# Altium footprint library WR-TBL_Wire Protector.PcbLib: 120 footprints (part 3 of 8)
Each footprint in its own frame and in the unit in brackets; x right, y up, seen from the top. Pads: shape width x height; smd on the part's side, far side on the other; paste and mask are expansions set on the pad; w line width, h text height; cw(c..) or ccw(c..) is an arc to the next point about the centre after c.
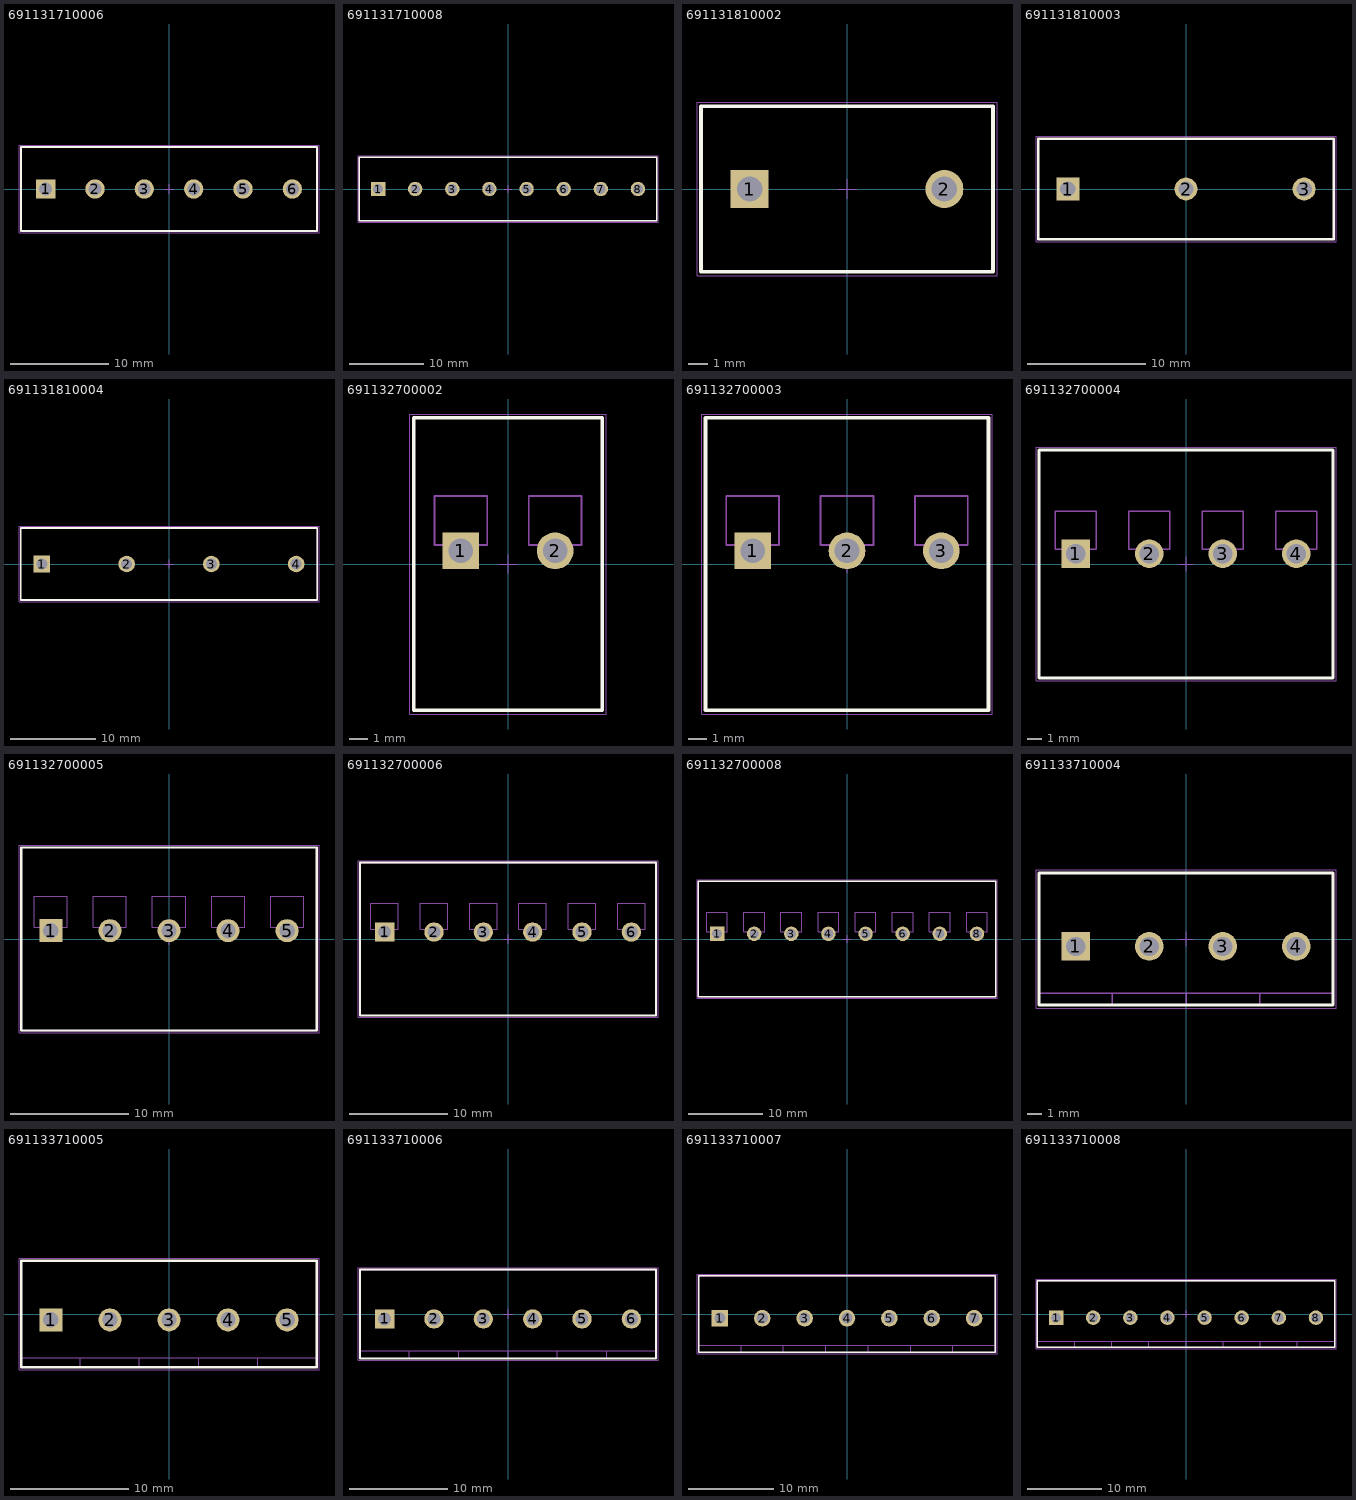
[diagram p2: the footprints below, top view; thin cyan lines are the x and y axes]

## 691131710006 [mm] "SERIE 1317 - 5.00 MM - HORIZONTAL CABLE ENTRY WITH PRESSURE CLAMP - WR-TBL"
height 15.5
pads (6):
  rect 1.95x1.95 hole 1.3: 1(-12.5,0)
  round 1.95 hole 1.3: 2(-7.5,0) 3(-2.5,0) 4(2.5,0) 5(7.5,0) 6(12.5,0)
Top Overlay:
  lines w0.2: -15,-4.25 -15,4.25 15,4.25 15,-4.25 -15,-4.25
Mechanical 13:
  lines w0.1: -15,-4.25 15,-4.25 15,4.25 -15,4.25 -15,-4.25
Mechanical 15:
  lines w0.05: -0.5,0 0.5,0 ; 0,-0.5 0,0.5 ; -15.2,-4.45 -15.2,4.45 15.2,4.45 15.2,-4.45 -15.2,-4.45
3D body "691131710006.stp": height 15.5, standoff -4.45, extent -15,-4.25 15,4.25

## 691131710008 [mm] "SERIE 1317 - 5.00 MM - HORIZONTAL CABLE ENTRY WITH PRESSURE CLAMP - WR-TBL"
height 15.5
pads (8):
  rect 1.95x1.95 hole 1.3: 1(-17.5,0)
  round 1.95 hole 1.3: 2(-12.5,0) 3(-7.5,0) 4(-2.5,0) 5(2.5,0) 6(7.5,0) 7(12.5,0) 8(17.5,0)
Top Overlay:
  lines w0.2: -20,-4.25 -20,4.25 20,4.25 20,-4.25 -20,-4.25
Mechanical 13:
  lines w0.1: -20,-4.25 20,-4.25 20,4.25 -20,4.25 -20,-4.25
Mechanical 15:
  lines w0.05: -0.5,0 0.5,0 ; 0,-0.5 0,0.5 ; -20.2,-4.45 -20.2,4.45 20.2,4.45 20.2,-4.45 -20.2,-4.45
3D body "691131710008.stp": height 15.5, standoff -4.45, extent -20,-4.25 20,4.25

## 691131810002 [mm] "Serie 1318 - 10.00 mm _2 pins"
height 15.5
pads (2):
  rect 1.95x1.95 hole 1.3: 1(-5,0)
  round 1.95 hole 1.3: 2(5,0)
Top Overlay:
  lines w0.2: -7.5,-4.25 -7.5,4.25 7.5,4.25 7.5,-4.25 -7.5,-4.25
Mechanical 13:
  lines w0.1: -7.5,-4.25 7.5,-4.25 7.5,4.25 -7.5,4.25 -7.5,-4.25
Mechanical 15:
  lines w0.05: -0.5,0 0.5,0 ; 0,-0.5 0,0.5 ; -7.7,-4.45 7.7,-4.45 7.7,4.45 -7.7,4.45 -7.7,-4.45
3D body "691131810002.stp": height 15.55, standoff -4.4, extent -7.5,-4.25 7.5,4.25

## 691131810003 [mm] "Serie 1318 - 10.00 mm _3 pins"
height 15.5
pads (3):
  rect 1.95x1.95 hole 1.3: 1(-10,0)
  round 1.95 hole 1.3: 2(0,0) 3(10,0)
Top Overlay:
  lines w0.2: -12.5,-4.25 -12.5,4.25 12.5,4.25 12.5,-4.25 -12.5,-4.25
Mechanical 13:
  lines w0.1: -12.5,-4.25 12.5,-4.25 12.5,4.25 -12.5,4.25 -12.5,-4.25
Mechanical 15:
  lines w0.05: -0.5,0 0.5,0 ; 0,-0.5 0,0.5 ; -12.7,-4.45 12.7,-4.45 12.7,4.45 -12.7,4.45 -12.7,-4.45
3D body "691131810003.stp": height 15.55, standoff -4.4, extent -12.5,-4.25 12.5,4.25

## 691131810004 [mm] "Serie 1318 - 10.00 mm _4 pins"
height 15.5
pads (4):
  rect 1.95x1.95 hole 1.3: 1(-15,0)
  round 1.95 hole 1.3: 2(-5,0) 3(5,0) 4(15,0)
Top Overlay:
  lines w0.2: -17.5,-4.25 -17.5,4.25 17.5,4.25 17.5,-4.25 -17.5,-4.25
Mechanical 13:
  lines w0.1: -17.5,-4.25 17.5,-4.25 17.5,4.25 -17.5,4.25 -17.5,-4.25
Mechanical 15:
  lines w0.05: -0.5,0 0.5,0 ; 0,-0.5 0,0.5 ; -17.7,-4.45 17.7,-4.45 17.7,4.45 -17.7,4.45 -17.7,-4.45
3D body "691131810004.stp": height 15.55, standoff -4.4, extent -17.5,-4.25 17.5,4.25

## 691132700002 [mm] "Vertical Entry with Pressure Clamp divisible, pitch 5mm, 02p"
height 10.5
pads (2):
  rect 1.95x1.95 hole 1.3: 1(-2.5,0.7)
  round 1.95 hole 1.3: 2(2.5,0.7)
Top Overlay:
  lines w0.2: -5,-7.75 -5,7.75 5,7.75 5,-7.75 -5,-7.75
Mechanical 13:
  lines w0.1: -5,-7.75 5,-7.75 5,7.75 -5,7.75 -5,-7.75 ; -3.9,1 -3.9,3.6 -1.1,3.6 -1.1,1 -3.9,1 ; 1.1,1 3.9,1 3.9,3.6 1.1,3.6 1.1,1
Mechanical 15:
  lines w0.05: -0.5,0 0.5,0 ; 0,-0.5 0,0.5 ; -5.2,-7.95 5.2,-7.95 5.2,7.95 -5.2,7.95 -5.2,-7.95
3D body "691132700002.stp": height 10.75, standoff -4.25, extent -5,-7.7 5,7.75

## 691132700003 [mm] "Vertical Entry with Pressure Clamp divisible, pitch 5mm, 03p"
height 10.5
pads (3):
  rect 1.95x1.95 hole 1.3: 1(-5,0.7)
  round 1.95 hole 1.3: 2(0,0.7) 3(5,0.7)
Top Overlay:
  lines w0.2: -7.5,-7.75 7.5,-7.75 7.5,7.75 -7.5,7.75 -7.5,-7.75
Mechanical 13:
  lines w0.1: -7.5,-7.75 -7.5,7.75 7.5,7.75 7.5,-7.75 -7.5,-7.75 ; -6.4,1 -3.6,1 -3.6,3.6 -6.4,3.6 -6.4,1 ; -1.4,1 -1.4,3.6 1.4,3.6 1.4,1 -1.4,1 ; 3.6,1 6.4,1 6.4,3.6 3.6,3.6 3.6,1
Mechanical 15:
  lines w0.05: -0.5,0 0.5,0 ; 0,-0.5 0,0.5 ; -7.7,-7.95 -7.7,7.95 7.7,7.95 7.7,-7.95 -7.7,-7.95
3D body "691132700003.stp": height 10.75, standoff -4.25, extent -7.5,-7.75 7.5,7.7

## 691132700004 [mm] "Vertical Entry with Pressure Clamp divisible, pitch 5mm, 04p"
height 10.5
pads (4):
  rect 1.95x1.95 hole 1.3: 1(-7.5,0.7)
  round 1.95 hole 1.3: 2(-2.5,0.7) 3(2.5,0.7) 4(7.5,0.7)
Top Overlay:
  lines w0.2: -10,-7.75 10,-7.75 10,7.75 -10,7.75 -10,-7.75
Mechanical 13:
  lines w0.1: -10,-7.75 -10,7.75 10,7.75 10,-7.75 -10,-7.75 ; -8.9,1 -6.1,1 -6.1,3.6 -8.9,3.6 -8.9,1 ; -3.9,1 -3.9,3.6 -1.1,3.6 -1.1,1 -3.9,1 ; 1.1,1 3.9,1 3.9,3.6 1.1,3.6 1.1,1 ; 6.1,1 6.1,3.6 8.9,3.6 8.9,1 6.1,1
Mechanical 15:
  lines w0.05: -0.5,0 0.5,0 ; 0,-0.5 0,0.5 ; -10.2,-7.95 -10.2,7.95 10.2,7.95 10.2,-7.95 -10.2,-7.95
3D body "691132700004.stp": height 10.75, standoff -4.25, extent -10,-7.75 10,7.7

## 691132700005 [mm] "Vertical Entry with Pressure Clamp divisible, pitch 5mm, 05p"
height 10.5
pads (5):
  rect 1.95x1.95 hole 1.3: 1(-10,0.7)
  round 1.95 hole 1.3: 2(-5,0.7) 3(0,0.7) 4(5,0.7) 5(10,0.7)
Top Overlay:
  lines w0.2: -12.5,-7.75 -12.5,7.75 12.5,7.75 12.5,-7.75 -12.5,-7.75
Mechanical 13:
  lines w0.1: -12.5,-7.75 12.5,-7.75 12.5,7.75 -12.5,7.75 -12.5,-7.75 ; -11.4,1 -11.4,3.6 -8.6,3.6 -8.6,1 -11.4,1 ; -6.4,1 -3.6,1 -3.6,3.6 -6.4,3.6 -6.4,1 ; -1.4,1 -1.4,3.6 1.4,3.6 1.4,1 -1.4,1 ; 3.6,1 6.4,1 6.4,3.6 3.6,3.6 3.6,1 ; 8.6,1 8.6,3.6 11.4,3.6 11.4,1 8.6,1
Mechanical 15:
  lines w0.05: -0.5,0 0.5,0 ; 0,-0.5 0,0.5 ; -12.7,-7.95 12.7,-7.95 12.7,7.95 -12.7,7.95 -12.7,-7.95
3D body "691132700005.stp": height 10.75, standoff -4.25, extent -12.5,-7.75 12.5,7.7

## 691132700006 [mm] "Vertical Entry with Pressure Clamp divisible, pitch 5mm, 06p"
height 10.5
pads (6):
  rect 1.95x1.95 hole 1.3: 1(-12.5,0.7)
  round 1.95 hole 1.3: 2(-7.5,0.7) 3(-2.5,0.7) 4(2.5,0.7) 5(7.5,0.7) 6(12.5,0.7)
Top Overlay:
  lines w0.2: -15,-7.75 -15,7.75 15,7.75 15,-7.75 -15,-7.75
Mechanical 13:
  lines w0.1: -15,-7.75 15,-7.75 15,7.75 -15,7.75 -15,-7.75 ; -13.9,1 -13.9,3.6 -11.1,3.6 -11.1,1 -13.9,1 ; -8.9,1 -6.1,1 -6.1,3.6 -8.9,3.6 -8.9,1 ; -3.9,1 -3.9,3.6 -1.1,3.6 -1.1,1 -3.9,1 ; 1.1,1 3.9,1 3.9,3.6 1.1,3.6 1.1,1 ; 6.1,1 6.1,3.6 8.9,3.6 8.9,1 6.1,1 ; 11.1,1 13.9,1 13.9,3.6 11.1,3.6 11.1,1
Mechanical 15:
  lines w0.05: -0.5,0 0.5,0 ; 0,-0.5 0,0.5 ; -15.2,-7.95 15.2,-7.95 15.2,7.95 -15.2,7.95 -15.2,-7.95
3D body "691132700006.stp": height 10.75, standoff -4.25, extent -15,-7.75 15,7.7

## 691132700008 [mm] "Vertical Entry with Pressure Clamp divisible, pitch 5mm, 08p"
height 10.5
pads (8):
  rect 1.95x1.95 hole 1.3: 1(-17.5,0.7)
  round 1.95 hole 1.3: 2(-12.5,0.7) 3(-7.5,0.7) 4(-2.5,0.7) 5(2.5,0.7) 6(7.5,0.7) 7(12.5,0.7) 8(17.5,0.7)
Top Overlay:
  lines w0.2: -20,-7.75 20,-7.75 20,7.75 -20,7.75 -20,-7.75
Mechanical 13:
  lines w0.1: -20,-7.75 -20,7.75 20,7.75 20,-7.75 -20,-7.75 ; -18.9,1 -16.1,1 -16.1,3.6 -18.9,3.6 -18.9,1 ; -13.9,1 -13.9,3.6 -11.1,3.6 -11.1,1 -13.9,1 ; -8.9,1 -6.1,1 -6.1,3.6 -8.9,3.6 -8.9,1 ; -3.9,1 -3.9,3.6 -1.1,3.6 -1.1,1 -3.9,1 ; 1.1,1 3.9,1 3.9,3.6 1.1,3.6 1.1,1 ; 6.1,1 6.1,3.6 8.9,3.6 8.9,1 6.1,1 ; 11.1,1 11.1,3.6 13.9,3.6 13.9,1 11.1,1 ; 16.1,1 18.9,1 18.9,3.6 16.1,3.6 16.1,1
Mechanical 15:
  lines w0.05: -0.5,0 0.5,0 ; 0,-0.5 0,0.5 ; -20.2,-7.95 -20.2,7.95 20.2,7.95 20.2,-7.95 -20.2,-7.95
3D body "691132700008.stp": height 10.75, standoff -4.25, extent -20,-7.75 20,7.7

## 691133710004 [mm] "Serie 1337 - 5.00 mm_4 pins"
height 13
pads (4):
  rect 1.95x1.95 hole 1.3: 1(-7.5,-0.5)
  round 1.95 hole 1.3: 2(-2.5,-0.5) 3(2.5,-0.5) 4(7.5,-0.5)
Top Overlay:
  lines w0.2: -10,-4.5 10,-4.5 10,4.5 -10,4.5 -10,-4.5
Mechanical 13:
  lines w0.1: -10,-3.7 10,-3.7 ; -5,-4.5 -5,-3.7 ; 0,-4.5 0,-3.7 ; 5,-4.5 5,-3.7 ; -10,-4.5 -10,4.5 10,4.5 10,-4.5 -10,-4.5
Mechanical 15:
  lines w0.05: -0.5,0 0.5,0 ; 0,-0.5 0,0.5 ; -10.2,-4.7 10.2,-4.7 10.2,4.7 -10.2,4.7 -10.2,-4.7
3D body "691133710004.stp": height 13.1, standoff -3.5, extent -10,-4.5 10,4.5

## 691133710005 [mm] "Serie 1337 - 5.00 mm_5 pins"
height 13
pads (5):
  rect 1.95x1.95 hole 1.3: 1(-10,-0.5)
  round 1.95 hole 1.3: 2(-5,-0.5) 3(0,-0.5) 4(5,-0.5) 5(10,-0.5)
Top Overlay:
  lines w0.2: -12.5,-4.5 12.5,-4.5 12.5,4.5 -12.5,4.5 -12.5,-4.5
Mechanical 13:
  lines w0.1: -12.5,-3.7 12.5,-3.7 ; -7.5,-4.5 -7.5,-3.7 ; -2.5,-4.5 -2.5,-3.7 ; 2.5,-4.5 2.5,-3.7 ; 7.5,-4.5 7.5,-3.7 ; -12.5,-4.5 -12.5,4.5 12.5,4.5 12.5,-4.5 -12.5,-4.5
Mechanical 15:
  lines w0.05: -0.5,0 0.5,0 ; 0,-0.5 0,0.5 ; -12.7,-4.7 12.7,-4.7 12.7,4.7 -12.7,4.7 -12.7,-4.7
3D body "691133710005.stp": height 13.1, standoff -3.5, extent -12.5,-4.5 12.5,4.5

## 691133710006 [mm] "Serie 1337 - 5.00 mm_6 pins"
height 13
pads (6):
  rect 1.95x1.95 hole 1.3: 1(-12.5,-0.5)
  round 1.95 hole 1.3: 2(-7.5,-0.5) 3(-2.5,-0.5) 4(2.5,-0.5) 5(7.5,-0.5) 6(12.5,-0.5)
Top Overlay:
  lines w0.2: -15,-4.5 15,-4.5 15,4.5 -15,4.5 -15,-4.5
Mechanical 13:
  lines w0.1: -15,-3.7 15,-3.7 ; -10,-4.5 -10,-3.7 ; -5,-4.5 -5,-3.7 ; 0,-4.5 0,-3.7 ; 5,-4.5 5,-3.7 ; 10,-4.5 10,-3.7 ; -15,-4.5 -15,4.5 15,4.5 15,-4.5 -15,-4.5
Mechanical 15:
  lines w0.05: -0.5,0 0.5,0 ; 0,-0.5 0,0.5 ; -15.2,-4.7 15.2,-4.7 15.2,4.7 -15.2,4.7 -15.2,-4.7
3D body "691133710006.stp": height 13.1, standoff -3.5, extent -15,-4.5 15,4.5

## 691133710007 [mm] "Serie 1337 - 5.00 mm_7 pins"
height 13
pads (7):
  rect 1.95x1.95 hole 1.3: 1(-15,-0.5)
  round 1.95 hole 1.3: 2(-10,-0.5) 3(-5,-0.5) 4(0,-0.5) 5(5,-0.5) 6(10,-0.5) 7(15,-0.5)
Top Overlay:
  lines w0.2: -17.5,-4.5 -17.5,4.5 17.5,4.5 17.5,-4.5 -17.5,-4.5
Mechanical 13:
  lines w0.1: -17.5,-3.7 17.5,-3.7 ; -12.5,-4.5 -12.5,-3.7 ; -7.5,-4.5 -7.5,-3.7 ; -2.5,-4.5 -2.5,-3.7 ; 2.5,-4.5 2.5,-3.7 ; 7.5,-4.5 7.5,-3.7 ; 12.5,-4.5 12.5,-3.7 ; -17.5,-4.5 17.5,-4.5 17.5,4.5 -17.5,4.5 -17.5,-4.5
Mechanical 15:
  lines w0.05: -0.5,0 0.5,0 ; 0,-0.5 0,0.5 ; -17.7,-4.7 -17.7,4.7 17.7,4.7 17.7,-4.7 -17.7,-4.7
3D body "691133710007.stp": height 13.1, standoff -3.5, extent -17.5,-4.5 17.5,4.5

## 691133710008 [mm] "Serie 1337 - 5.00 mm_8 pins"
height 13
pads (8):
  rect 1.95x1.95 hole 1.3: 1(-17.5,-0.5)
  round 1.95 hole 1.3: 2(-12.5,-0.5) 3(-7.5,-0.5) 4(-2.5,-0.5) 5(2.5,-0.5) 6(7.5,-0.5) 7(12.5,-0.5) 8(17.5,-0.5)
Top Overlay:
  lines w0.2: -20,-4.5 -20,4.5 20,4.5 20,-4.5 -20,-4.5
Mechanical 13:
  lines w0.1: -20,-3.7 20,-3.7 ; -15,-4.5 -15,-3.7 ; -10,-4.5 -10,-3.7 ; -5,-4.5 -5,-3.7 ; 0,-4.5 0,-3.7 ; 5,-4.5 5,-3.7 ; 10,-4.5 10,-3.7 ; 15,-4.5 15,-3.7 ; -20,-4.5 20,-4.5 20,4.5 -20,4.5 -20,-4.5
Mechanical 15:
  lines w0.05: -0.5,0 0.5,0 ; 0,-0.5 0,0.5 ; -20.2,-4.7 -20.2,4.7 20.2,4.7 20.2,-4.7 -20.2,-4.7
3D body "691133710008.stp": height 13.1, standoff -3.5, extent -20,-4.5 20,4.5